# Altium footprint library CeleronLib_SMD.PcbLib: 198 footprints (part 2 of 13)
Each footprint in its own frame and in the unit in brackets; x right, y up, seen from the top. Pads: shape width x height; smd on the part's side, far side on the other; paste and mask are expansions set on the pad; w line width, h text height; cw(c..) or ccw(c..) is an arc to the next point about the centre after c.
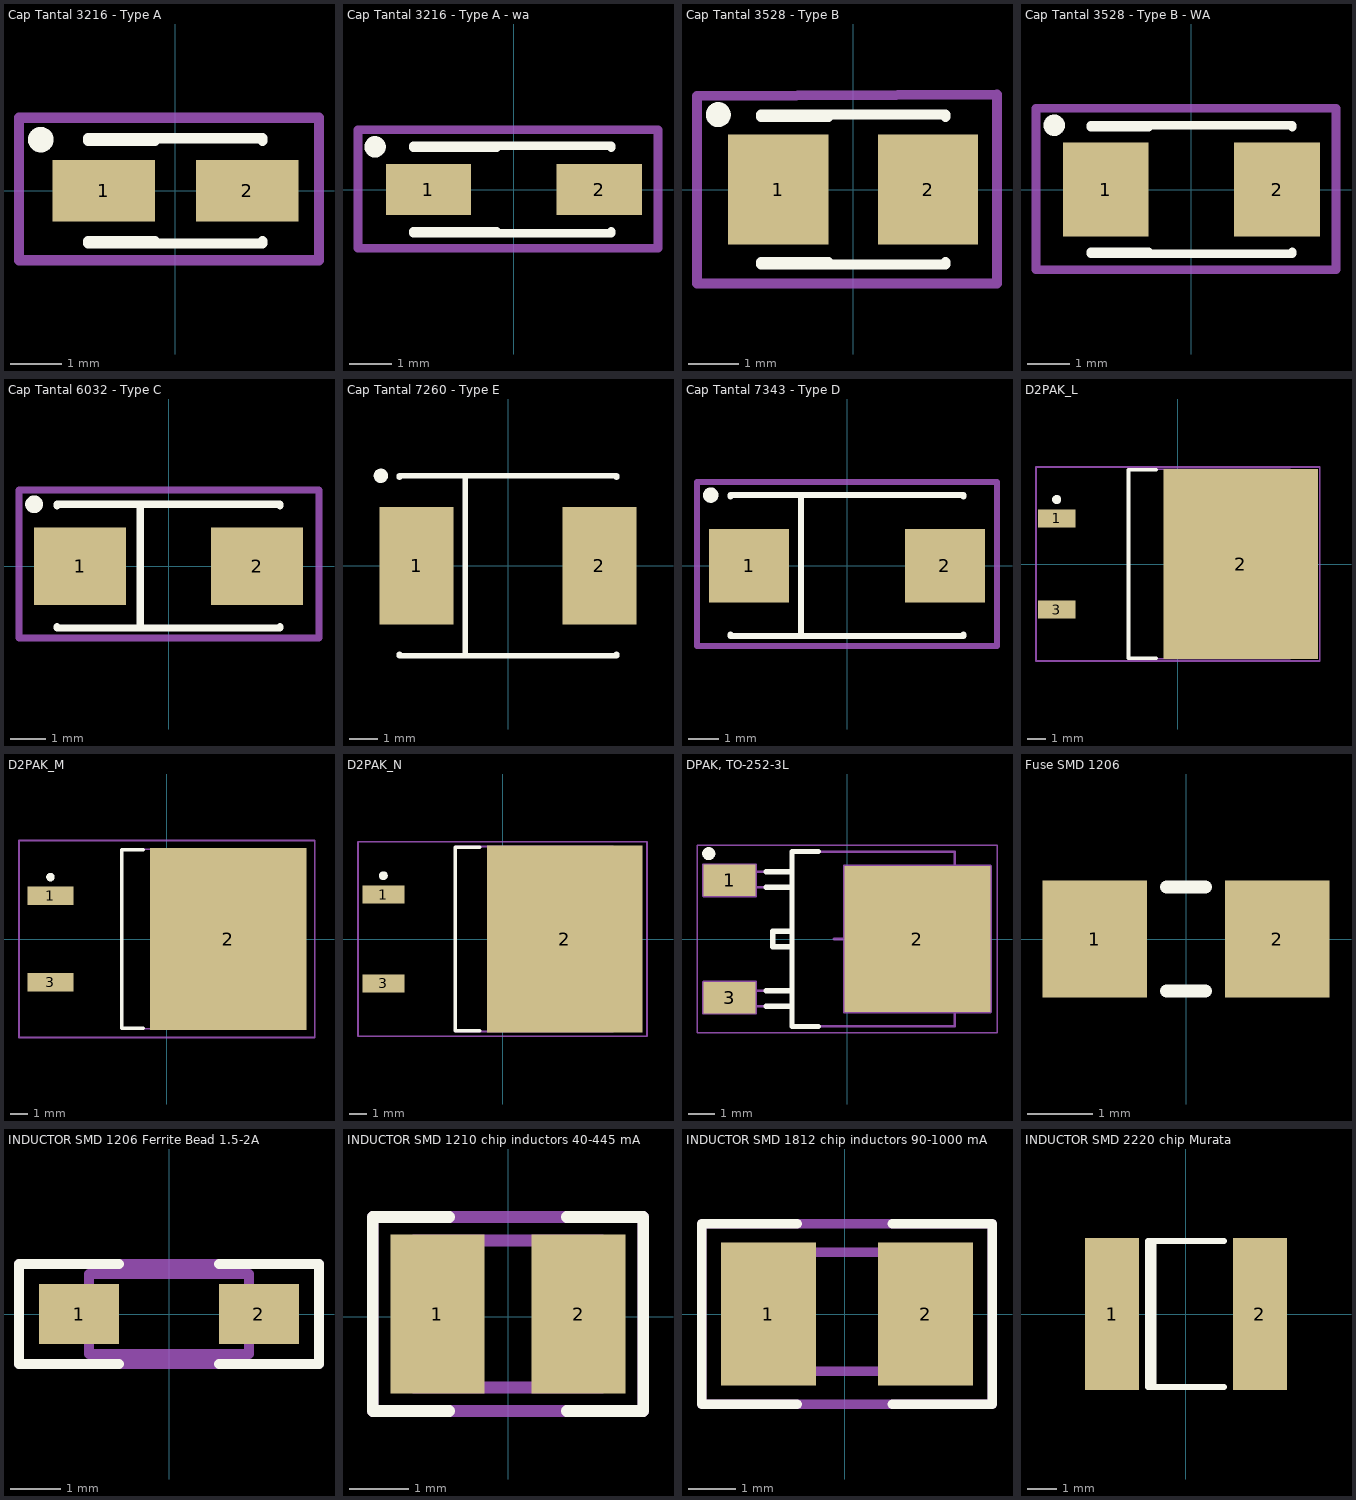
[diagram p1: the footprints below, top view; thin cyan lines are the x and y axes]

## Cap Tantal 3216 - Type A [mm] "Capacitor, SM Tantalum; Body 3.2 x 1.6 mm (LxW typ)"
height 1.8
pads (2):
  rect 2x1.2 smd: 1(-1.4,0) 2(1.4,0)
Top Overlay:
  circle w0.25: c-2.625,1 r0.125
  lines w0.2: -1.7,-1.025 1.7,-1.025 1.7,-0.975 ; -1.7,-0.975 -0.4,-0.975 ; -1.7,0.975 -0.4,0.975 ; -1.7,1.025 1.7,1.025 1.7,0.975
Top Courtyard:
  lines w0.2: -3.05,-1.35 -3.05,1.425 2.8,1.425 2.8,-1.35 -3.05,-1.35
3D body: height 1.6, standoff 0, extent -1.6,-0.8 1.6,0.8

## Cap Tantal 3216 - Type A - wa [mm] "Capacitor, SM Tantalum; Body 3.2 x 1.6 mm (LxW typ)"
height 1.8
pads (2):
  rect 2x1.2 smd: 1(-2,0) 2(2,0)
Top Overlay:
  circle w0.25: c-3.25,1 r0.125
  lines w0.2: -2.35,-1.025 2.275,-1.025 2.275,-0.975 ; -2.35,-0.975 -0.4,-0.975 ; -2.35,0.975 -0.4,0.975 ; -2.35,1.025 2.275,1.025 2.275,0.975
Top Courtyard:
  lines w0.2: -3.65,-1.375 -3.65,1.4 3.375,1.4 3.375,-1.375 -3.65,-1.375
3D body: height 1.6, standoff 0, extent -1.6,-0.8 1.6,0.8

## Cap Tantal 3528 - Type B [mm] "Capacitor, SM Tantalum; Body 3.5 x 2.8 mm (LxW typ)"
height 2.1
pads (2):
  rect 2x2.2 smd: 1(-1.5,0) 2(1.5,0)
Top Overlay:
  circle w0.25: c-2.7,1.5 r0.125
  lines w0.2: -1.85,-1.5 1.85,-1.5 1.85,-1.45 ; -1.85,-1.45 -0.5,-1.45 ; -1.85,1.45 -0.5,1.45 ; -1.85,1.5 1.85,1.5 1.85,1.45
Top Courtyard:
  lines w0.2: -3.125,-1.875 -3.125,1.875 2.875,1.9 2.875,-1.875 -3.125,-1.875
3D body: height 2.03, standoff 0, extent -1.85,-1.465 1.85,1.465

## Cap Tantal 3528 - Type B - WA [mm] "Capacitor, SM Tantalum; Body 3.5 x 2.8 mm (LxW typ)"
height 2.1
pads (2):
  rect 2x2.2 smd: 1(-2,0) 2(2,0)
Top Overlay:
  circle w0.25: c-3.2,1.5 r0.125
  lines w0.2: -2.35,-1.5 -1.3,-1.5 ; -2.35,-1.45 -1,-1.45 ; -2.35,1.45 -1,1.45 ; -2.35,1.5 -1.3,1.5 ; -1.35,-1.5 2.35,-1.5 2.35,-1.45 ; -1.35,1.5 2.35,1.5 2.35,1.45
Top Courtyard:
  lines w0.2: -3.625,-1.875 3.375,-1.875 3.375,1.9 -3.625,1.9 -3.625,-1.875
3D body: height 2.03, standoff 0, extent -1.85,-1.465 1.85,1.465

## Cap Tantal 6032 - Type C [mm] "Capacitor, SM Tantalum; Body 6.0 x 3.2 mm (LxW typ)"
height 2.8
pads (2):
  rect 2.6x2.2 smd: 1(-2.5,0) 2(2.5,0)
Top Overlay:
  circle w0.25: c-3.8,1.75 r0.125
  lines w0.2: -3.15,-1.7 -3.15,-1.75 3.15,-1.75 3.15,-1.7 ; -3.15,1.7 -3.15,1.75 3.15,1.75 3.15,1.7 ; -0.8,-1.75 -0.8,1.75
Top Courtyard:
  lines w0.2: -4.225,-2.025 4.25,-2.025 4.25,2.15 -4.225,2.15 -4.225,-2.025
3D body: height 2.8, standoff 0, extent -3.15,-1.75 3.15,1.75

## Cap Tantal 7260 - Type E [mm] "Capacitor, SM Tantalum; Body 7.3 x 6.0 mm (LxW typ)"
height 3.8
pads (2):
  rect 2.6x4.1 smd: 1(-3.2,0) 2(3.2,0)
Top Overlay:
  circle w0.25: c-4.45,3.15 r0.125
  lines w0.2: -3.8,-3.1 -3.8,-3.15 3.8,-3.15 3.8,-3.1 ; -3.8,3.1 -3.8,3.15 3.8,3.15 3.8,3.1 ; -1.5,-3.15 -1.5,3.15
3D body: height 3.6, standoff 0, extent -3.65,-3 3.65,3

## Cap Tantal 7343 - Type D [mm] "Capacitor, SM Tantalum; Body 7.3 x 4.3 mm (LxW typ)"
height 3.1
pads (2):
  rect 2.6x2.4 smd: 1(-3.2,0) 2(3.2,0)
Top Overlay:
  circle w0.25: c-4.45,2.3 r0.125
  lines w0.2: -3.8,-2.25 -3.8,-2.3 3.8,-2.3 3.8,-2.25 ; -3.8,2.25 -3.8,2.3 3.8,2.3 3.8,2.25 ; -1.5,-2.3 -1.5,2.3
Top Courtyard:
  lines w0.2: -4.9,-2.625 -4.9,2.725 4.9,2.725 4.9,-2.625 -4.9,-2.625
3D body: height 3.1, standoff 0, extent -3.8,-2.3 3.8,2.3

## D2PAK_L [mm] "D2-PAK, 4-Leads, Body 8.8x10.4mm, Pitch 2.54mm, Lead Span 15.1mm, IPC High Density"
height 4.69
pads (3):
  rect 2.1x1 smd: 1(-6.75,2.54) 3(-6.75,-2.54)
  rect 8.6x10.6 smd: 2(3.5,0)
Top Overlay:
  circle w0.25: c-6.75,3.59 r0.125
  lines w0.2: -1.2,-5.25 -2.75,-5.25 -2.75,5.25 -1.2,5.25
Top Assy:
  lines w0.1: -2.75,-5.275 6.25,-5.275 6.25,5.275 -2.75,5.275 -2.75,-5.275
Top Courtyard:
  lines w0.1: -0.5,0 0.5,0 ; 0,-0.5 0,0.5 ; -7.9,-5.4 7.9,-5.4 7.9,5.4 -7.9,5.4 -7.9,-5.4
3D body: height 4.69, standoff 0, extent -2.75,-5.275 6.25,5.275

## D2PAK_M [mm] "D2-PAK, 4-Leads, Body 8.8x10.4mm, Pitch 2.54mm, Lead Span 15.1mm, IPC Low Density"
height 4.69
pads (3):
  rect 2.7x1.1 smd: 1(-6.85,2.54) 3(-6.85,-2.54)
  rect 9.2x10.7 smd: 2(3.6,0)
Top Overlay:
  circle w0.25: c-6.85,3.64 r0.125
  lines w0.2: -1.4,-5.25 -2.65,-5.25 -2.65,5.25 -1.4,5.25
Top Assy:
  lines w0.1: -2.65,-5.275 -2.65,5.275 6.35,5.275 6.35,-5.275 -2.65,-5.275
Top Courtyard:
  lines w0.1: -0.5,0 0.5,0 ; 0,-0.5 0,0.5 ; -8.7,-5.8 -8.7,5.8 8.7,5.8 8.7,-5.8 -8.7,-5.8
3D body: height 4.69, standoff 0, extent -2.65,-5.275 6.35,5.275

## D2PAK_N [mm] "D2-PAK, 4-Leads, Body 8.8x10.4mm, Pitch 2.54mm, Lead Span 15.1mm, IPC Medium Density"
height 4.69
pads (3):
  rect 2.4x1.05 smd: 1(-6.8,2.54) 3(-6.8,-2.54)
  rect 8.9x10.65 smd: 2(3.55,0)
Top Overlay:
  circle w0.25: c-6.8,3.615 r0.125
  lines w0.2: -1.3,-5.25 -2.7,-5.25 -2.7,5.25 -1.3,5.25
Top Assy:
  lines w0.1: -2.7,-5.275 -2.7,5.275 6.3,5.275 6.3,-5.275 -2.7,-5.275
Top Courtyard:
  lines w0.1: -0.5,0 0.5,0 ; 0,-0.5 0,0.5 ; -8.25,-5.55 -8.25,5.55 8.25,5.55 8.25,-5.55 -8.25,-5.55
3D body: height 4.69, standoff 0, extent -2.7,-5.275 6.3,5.275

## DPAK, TO-252-3L [mm] "DPAK TO-252, 2.28mm pitch; 2 pin, 9.7mm L X 6.7mm W X 2.40mm H body"
height 2.4
pads (3):
  rect 2x1.2 smd: 1(-4.5,2.25) 3(-4.5,-2.25)
  rect 5.6x5.6 smd: 2(2.7,0)
Top Overlay:
  circle w0.25: c-5.3,3.27 r0.125
  lines w0.2: -3.1,-2.58 -2.104,-2.58 ; -3.1,-1.98 -2.104,-1.98 ; -3.1,1.98 -2.104,1.98 ; -3.1,2.58 -2.104,2.58 ; -2.104,-0.3 -2.844,-0.3 -2.844,0.3 -2.104,0.3 ; -1.104,-3.35 -2.104,-3.35 -2.104,3.35 -1.104,3.35
Top Paste:
  region: 0.47,-2.05 2.35,-2.05 2.35,-0.35 0.47,-0.35
  region: 3.05,-2.05 4.93,-2.05 4.93,-0.35 3.05,-0.35
  region: 0.47,0.35 2.35,0.35 2.35,2.05 0.47,2.05
  region: 3.05,0.35 4.93,0.35 4.93,2.05 3.05,2.05
Mechanical 8:
  lines w0.1: -5,-2.25 -4.5,-2.25 ; -5,2.25 -4.5,2.25 ; -4.5,-2.75 -4.5,-2.25 ; -4.5,-1.75 -4.5,-2.25 ; -4.5,1.75 -4.5,2.25 ; -4.5,2.75 -4.5,2.25 ; -4,-2.25 -4.5,-2.25 ; -4,2.25 -4.5,2.25 ; -0.5,0 0,0 ; 0,-0.5 0,0 ; 0,0.5 0,0 ; 0.5,0 0,0 ; 2.2,0 2.7,0 ; 2.7,-0.5 2.7,0 ; 2.7,0.5 2.7,0 ; 3.2,0 2.7,0 ; -5.5,-2.85 -5.5,-1.65 -3.5,-1.65 -3.5,-2.85 -5.5,-2.85 ; -5.5,1.65 -5.5,2.85 -3.5,2.85 -3.5,1.65 -5.5,1.65 ; -0.1,-2.8 -0.1,2.8 5.5,2.8 5.5,-2.8 -0.1,-2.8
Top Assy:
  lines w0.1: -2.104,-2.58 -5.2,-2.58 -5.2,-1.98 -2.104,-1.98 ; -2.104,-0.3 -2.844,-0.3 -2.844,0.3 -2.104,0.3 ; -2.104,1.98 -5.2,1.98 -5.2,2.58 -2.104,2.58 ; 4.125,-2.7 4.8,-2.7 ccw(c4.8,-2.3) 5.2,-2.3 5.2,2.3 ccw(c4.8,2.3) 4.8,2.7 4.125,2.7 ; -2.104,-3.35 4.125,-3.35 4.125,3.35 -2.104,3.35 -2.104,-3.35
Top Courtyard:
  lines w0.05: -5.75,-3.6 -5.75,3.6 5.75,3.6 5.75,-3.6 -5.75,-3.6
3D body: height 2.4, standoff 0, extent -5.2,-3.35 5.2,3.35

## Fuse SMD 1206 [mm] "Chip Fuse Body 3.1 x 1.6 mm (LxW typ)"
height 3.2
pads (2):
  rect 1.6x1.8 smd: 1(-1.4,0) 2(1.4,0)
Top Overlay:
  lines w0.2: -0.3,-0.8 0.3,-0.8 ; -0.3,0.8 0.3,0.8

## INDUCTOR SMD 1206 Ferrite Bead 1.5-2A [mm] "Chip Ferrite Bead (1206 Size) 1.5-2A"
height 3.2
pads (2):
  rect 1.6x1.2 smd: 1(-1.8,0) 2(1.8,0)
Top Overlay:
  lines w0.2: -1,-1 -3,-1 -3,1 -1,1 ; 1,-1 3,-1 3,1 1,1
Top Assy:
  lines w0.2: -1.6,-0.8 -1.6,0.8 0,0.8 1.6,0.8 1.6,-0.8 -1.6,-0.8
Top Courtyard:
  lines w0.2: -3,-1 3,-1 3,1 -3,1 -3,-1
3D body: height 1.1, standoff 0, extent -1.6,-0.8 1.6,0.8

## INDUCTOR SMD 1210 chip inductors 40-445 mA [mm] "Chip Ferrite Bead (1206 Size) 1.5-2A"
height 2.2
pads (2):
  rect 1.6x2.7 smd: 1(-1.2,0.05) 2(1.2,0.05)
Top Overlay:
  lines w0.2: -1,-1.6 -2.3,-1.6 -2.3,1.7 -1,1.7 ; 1,-1.6 2.3,-1.6 2.3,1.7 1,1.7
Top Assy:
  lines w0.2: -1.6,-1.2 -1.6,1.3 1.6,1.3 1.6,-1.2 -1.6,-1.2
Top Courtyard:
  lines w0.2: -2.3,-1.6 -2.3,1.7 2.3,1.7 2.3,-1.6 -2.3,-1.6
3D body: height -0.4, standoff -2.4, extent -1.6,-1.176 1.6,1.324

## INDUCTOR SMD 1812 chip inductors 90-1000 mA [mm] "Chip SMD INDUCTOR/BEADS (1812 Size) 90-1000 mA"
height 2.8
pads (2):
  rect 2x3 smd: 1(-1.6,0) 2(1.7,0)
Top Overlay:
  lines w0.2: -1,-1.9 -3,-1.9 -3,1.9 -1,1.9 ; 1,-1.9 3.1,-1.9 3.1,1.9 1,1.9
Top Assy:
  lines w0.2: -1.6,-1.2 1.6,-1.2 1.6,1.3 -1.6,1.3 -1.6,-1.2
Top Courtyard:
  lines w0.2: -3,-1.9 3.1,-1.9 3.1,1.9 -3,1.9 -3,-1.9
3D body: height 2.6, standoff 0, extent -2.2,-1.61 2.3,1.59

## INDUCTOR SMD 2220 chip Murata [mm] "Chip Capacitor, Inductor Murata; Body 5.7 x 5.0 mm (LxW typ)"
height 1.8
pads (2):
  rect 1.85x5.2 smd: 1(-2.525,0) 2(2.525,0)
Top Overlay:
  lines w0.2: -1.11,-2.5 -1.11,2.5 ; 1.3,-2.5 -1.3,-2.5 -1.3,2.5 1.3,2.5